# Altium footprint library AOO.PcbLib: 131 footprints (part 2 of 9)
Each footprint in its own frame and in the unit in brackets; x right, y up, seen from the top. Pads: shape width x height; smd on the part's side, far side on the other; paste and mask are expansions set on the pad; w line width, h text height; cw(c..) or ccw(c..) is an arc to the next point about the centre after c.
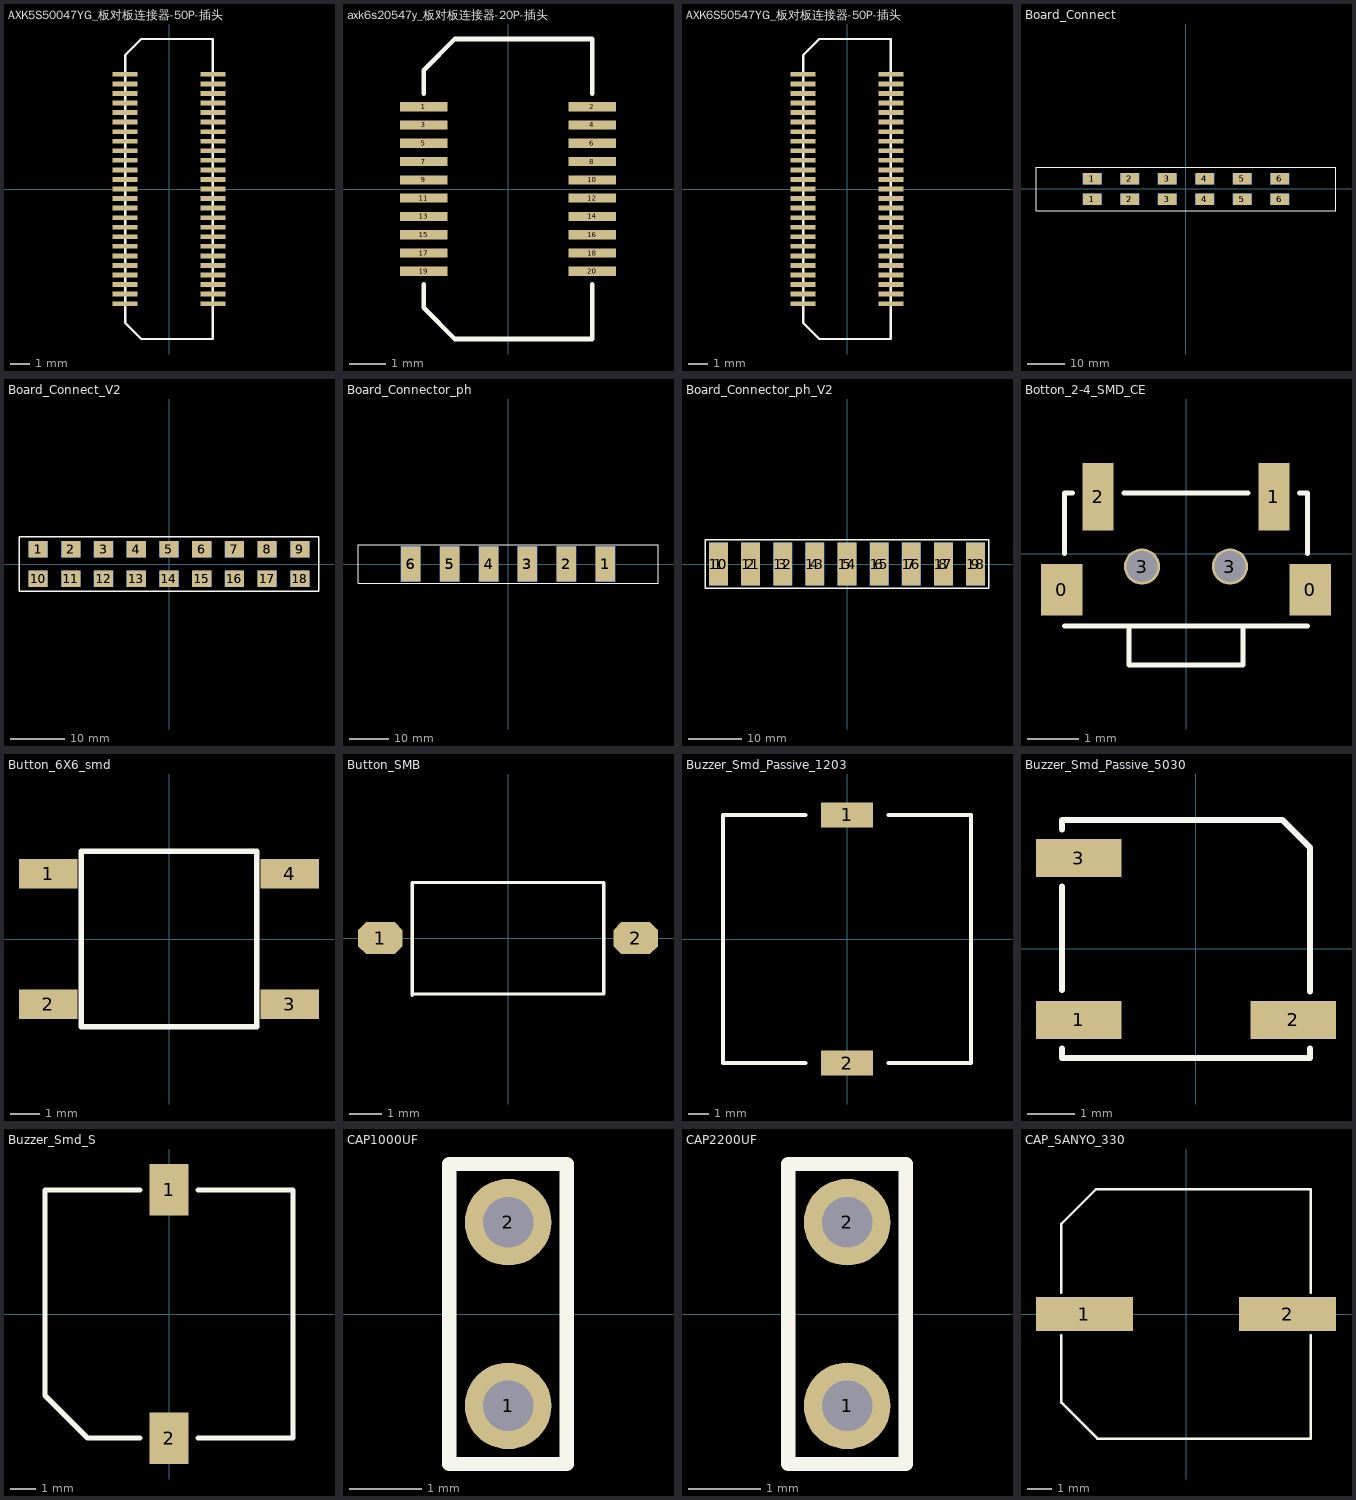
[diagram p1: the footprints below, top view; thin cyan lines are the x and y axes]

## AXK5S50047YG_板对板连接器-50P-插头 [mm] "TBU_P500-G120"
pads (50):
  rect 1.3x0.25 smd: 1(-2.3,6) 2(2.3,6) 3(-2.3,5.5) 4(2.3,5.5) 5(-2.3,5) 6(2.3,5) 7(-2.3,4.5) 8(2.3,4.5) 9(-2.3,4) 10(2.3,4) 11(-2.3,3.5) 12(2.3,3.5) 13(-2.3,3) 14(2.3,3) 15(-2.3,2.5) 16(2.3,2.5) 17(-2.3,2) 18(2.3,2) 19(-2.3,1.5) 20(2.3,1.5) 21(-2.3,1) 22(2.3,1) 23(-2.3,0.5) 24(2.3,0.5) 25(-2.3,0) 26(2.3,0) 27(-2.3,-0.5) 28(2.3,-0.5) 29(-2.3,-1) 30(2.3,-1) 31(-2.3,-1.5) 32(2.3,-1.5) 33(-2.3,-2) 34(2.3,-2) 35(-2.3,-2.5) 36(2.3,-2.5) 37(-2.3,-3) 38(2.3,-3) 39(-2.3,-3.5) 40(2.3,-3.5) 41(-2.3,-4) 42(2.3,-4) 43(-2.3,-4.5) 44(2.3,-4.5) 45(-2.3,-5) 46(2.3,-5) 47(-2.3,-5.5) 48(2.3,-5.5) 49(-2.3,-6) 50(2.3,-6)
Top Overlay:
  lines w0.127: -2.3,-7 -1.45,-7.85 2.3,-7.85 2.3,7.85 -1.45,7.85 -2.3,7 -2.3,-7
3D body: height 3.02, standoff 0.02, extent -2.7,-7.85 2.7,7.85

## axk6s20547y_板对板连接器-20P-插头 [mm] "TBU_P500-G120"
pads (20):
  rect 1.3x0.25 smd: 1(-2.3,2.25) 2(2.3,2.25) 3(-2.3,1.75) 4(2.3,1.75) 5(-2.3,1.25) 6(2.3,1.25) 7(-2.3,0.75) 8(2.3,0.75) 9(-2.3,0.25) 10(2.3,0.25) 11(-2.3,-0.25) 12(2.3,-0.25) 13(-2.3,-0.75) 14(2.3,-0.75) 15(-2.3,-1.25) 16(2.3,-1.25) 17(-2.3,-1.75) 18(2.3,-1.75) 19(-2.3,-2.25) 20(2.3,-2.25)
Top Overlay:
  lines w0.127: -2.3,-2.6 -2.3,-3.25 -1.45,-4.1 2.3,-4.1 2.3,-2.6 ; -2.3,2.6 -2.3,3.25 -1.45,4.1 2.3,4.1 2.3,2.6
3D body: height 4.27, standoff -0.02, extent -2.5,-4.1 2.5,4.1

## AXK6S50547YG_板对板连接器-50P-插头 [mm] "TBU_P500-G120"
pads (50):
  rect 1.3x0.25 smd: 1(-2.3,6) 2(2.3,6) 3(-2.3,5.5) 4(2.3,5.5) 5(-2.3,5) 6(2.3,5) 7(-2.3,4.5) 8(2.3,4.5) 9(-2.3,4) 10(2.3,4) 11(-2.3,3.5) 12(2.3,3.5) 13(-2.3,3) 14(2.3,3) 15(-2.3,2.5) 16(2.3,2.5) 17(-2.3,2) 18(2.3,2) 19(-2.3,1.5) 20(2.3,1.5) 21(-2.3,1) 22(2.3,1) 23(-2.3,0.5) 24(2.3,0.5) 25(-2.3,0) 26(2.3,0) 27(-2.3,-0.5) 28(2.3,-0.5) 29(-2.3,-1) 30(2.3,-1) 31(-2.3,-1.5) 32(2.3,-1.5) 33(-2.3,-2) 34(2.3,-2) 35(-2.3,-2.5) 36(2.3,-2.5) 37(-2.3,-3) 38(2.3,-3) 39(-2.3,-3.5) 40(2.3,-3.5) 41(-2.3,-4) 42(2.3,-4) 43(-2.3,-4.5) 44(2.3,-4.5) 45(-2.3,-5) 46(2.3,-5) 47(-2.3,-5.5) 48(2.3,-5.5) 49(-2.3,-6) 50(2.3,-6)
Top Overlay:
  lines w0.127: -2.3,-7 -2.3,7 -1.45,7.85 2.3,7.85 2.3,-7.85 -1.45,-7.85 -2.3,-7
3D body: height 4.27, standoff 0.02, extent -2.5,-7.85 2.5,7.85

## Board_Connect [mm]
pads (24):
  rect 5x3 smd: 1(-25,-2.75) 1(-25,2.75) 2(-15,-2.75) 2(-15,2.75) 3(-5,-2.75) 3(-5,2.75) 4(5,-2.75) 4(5,2.75) 5(15,-2.75) 5(15,2.75) 6(25,-2.75) 6(25,2.75)
  rect 5x3 smd far side: 1(-25,-2.75) 1(-25,2.75) 2(-15,-2.75) 2(-15,2.75) 3(-5,-2.75) 3(-5,2.75) 4(5,-2.75) 4(5,2.75) 5(15,-2.75) 5(15,2.75) 6(25,-2.75) 6(25,2.75)
Top Overlay:
  lines w0.254: -40,-5.75 40,-5.75 40,5.75 -40,5.75 -40,-5.75

## Board_Connect_V2 [mm]
pads (36):
  rect 3.5x3 smd: 1(-24,2.7) 2(-18,2.7) 3(-12,2.7) 4(-6,2.7) 5(0,2.7) 6(6,2.7) 7(12,2.7) 8(18,2.7) 9(24,2.7) 10(-24,-2.7) 11(-18,-2.7) 12(-12,-2.7) 13(-6,-2.7) 14(0,-2.7) 15(6,-2.7) 16(12,-2.7) 17(18,-2.7) 18(24,-2.7)
  rect 3.5x3 smd far side: 1(-24,2.7) 2(-18,2.7) 3(-12,2.7) 4(-6,2.7) 5(0,2.7) 6(6,2.7) 7(12,2.7) 8(18,2.7) 9(24,2.7) 10(-24,-2.7) 11(-18,-2.7) 12(-12,-2.7) 13(-6,-2.7) 14(0,-2.7) 15(6,-2.7) 16(12,-2.7) 17(18,-2.7) 18(24,-2.7)
Top Overlay:
  lines w0.254: -27.5,-5 -27.5,5 27.5,5 27.5,-5 -27.5,-5

## Board_Connector_ph [mm]
pads (12):
  rect 5x9 smd far side: 1(25,0) 2(15,0) 3(5,0) 4(-5,0) 5(-15,0) 6(-25,0)
  rect 5x9 smd: 1(25,0) 2(15,0) 3(5,0) 4(-5,0) 5(-15,0) 6(-25,0)
Top Overlay:
  lines w0.254: -38.5,-5 -38.5,5 38.5,5 38.5,-5 -38.5,-5

## Board_Connector_ph_V2 [mm]
pads (19):
  rect 3.5x8 smd: 1(-24,0) 2(-18,0) 3(-12,0) 4(-6,0) 5(0,0) 6(6,0) 7(12,0) 8(18,0) 9(24,0)
  rect 3.5x8 smd far side: 10(-24,0) 10(-24,0) 11(-18,0) 12(-12,0) 13(-6,0) 14(0,0) 15(6,0) 16(12,0) 17(18,0) 18(24,0)
Top Overlay:
  lines w0.254: -26.5,-4.5 -26.5,4.5 26.5,4.5 26.5,-4.5 -26.5,-4.5

## Botton_2-4_SMD_CE [mm]
pads (6):
  rect 0.8x1 smd: 0(-2.4,-0.7) 0(2.4,-0.7)
  rect 0.6x1.3 smd: 1(1.7,1.1) 2(-1.7,1.1)
  round 0.7 hole 0.6: 3(-0.85,-0.25) 3(0.85,-0.25)
Top Overlay:
  lines w0.1: -2.35,-1.4 -2.2,-1.4 2.3,-1.4 2.35,-1.4 ; -2.35,0 -2.35,1.175 -2.2,1.175 ; -1.2,1.175 1.2,1.175 ; -1.1,-1.4 -1.1,-2.15 1.1,-2.15 1.1,-1.4 ; 2.2,1.175 2.35,1.175 2.35,0
3D body: height 1.81, standoff -0.44, extent -2.35,-2.15 2.35,1.35

## Button_6X6_smd [mm]
pads (4):
  rect 2x1 smd: 1(-4.125,2.225) 2(-4.125,-2.225) 3(4.125,-2.225) 4(4.125,2.225)
Top Overlay:
  lines w0.2: -3,-3 3,-3 3,3 -3,3 -3,-3
3D body: height 10.61, standoff 0.01, extent -4.65,-3 4.65,3

## Button_SMB [mm] "贴片按键开关"
pads (2):
  oct 1.4x1 smd: 1(-4,0) 2(4,0)
Top Overlay:
  lines w0.1: -3,-1.8 -3,1.75 3,1.75 3,-1.75 -3,-1.75
3D body: height 2.52, standoff 0.02, extent -3.949,-1.9 3.941,1.95

## Buzzer_Smd_Passive_1203 [mm]
pads (2):
  rect 2.5x1.2 smd: 1(0,6) 2(0,-6)
Top Overlay:
  lines w0.2: -2,-6 -6,-6 -6,6 -2,6 ; 2,-6 6,-6 6,6 2,6

## Buzzer_Smd_Passive_5030 [mm] "Buzzer_Smd_Passive_5030"
pads (3):
  rect 1.8x0.8 smd: 1(-2.45,-1.5) 2(2.05,-1.5) 3(-2.45,1.9)
Top Overlay:
  lines w0.127: -2.8,-2.1 -2.8,-2.3 2.4,-2.3 2.4,-2.1 ; -2.8,-0.875 -2.8,1.3 ; -2.8,2.5 -2.8,2.7 1.825,2.7 2.4,2.125 2.4,-0.9
3D body: height 2.06, standoff 0.01, extent -2.8,-2.3 2.4,2.7

## Buzzer_Smd_S [mm]
pads (2):
  rect 1.5x2 smd: 1(0,4.8) 2(0,-4.8)
Top Overlay:
  lines w0.2: -1.125,-4.8 -3.15,-4.8 -4.8,-3.15 -4.8,4.8 -1.125,4.8 ; 1.125,-4.8 4.8,-4.8 4.8,4.8 1.125,4.8
3D body: height 5.52, standoff 0.02, extent -4.8,-4.9 4.8,4.9

## CAP1000UF [mm] "CAP"
pads (2):
  round 1.2 hole 0.7: 1(-3.81,-1.27) 2(-3.81,1.27)
Top Overlay:
  lines w0.2: -4.625,-2.075 -3,-2.075 -3,2.075 -4.625,2.075 -4.625,-2.075
3D body: height 7, standoff -3, extent -16.3,-1.54 -3.5,18.8

## CAP2200UF [mm] "CAP"
pads (2):
  round 1.2 hole 0.7: 1(-3.81,-1.27) 2(-3.81,1.27)
Top Overlay:
  lines w0.2: -4.625,-2.075 -4.625,2.075 -3,2.075 -3,-2.075 -4.625,-2.075
3D body: height 8.75, standoff -4.75, extent -19.05,-1.54 -3.5,22.8

## CAP_SANYO_330 [mm] "贴片电解电容"
pads (2):
  rect 4x1.4 smd: 1(-4.2,0) 2(4.2,0)
Top Overlay:
  lines w0.1: -5.15,-0.875 -5.15,-3.66 -3.66,-5.15 5.15,-5.15 5.15,-0.875 ; -5.15,0.875 -5.15,3.73 -3.73,5.15 5.15,5.15 5.15,0.875
3D body: height 10.13, standoff 0.02, extent -5.56,-5.15 5.54,5.15